# Altium footprint library NDLib.PCBLIB: 499 footprints (part 5 of 32)
Each footprint in its own frame and in the unit in brackets; x right, y up, seen from the top. Pads: shape width x height; smd on the part's side, far side on the other; paste and mask are expansions set on the pad; w line width, h text height; cw(c..) or ccw(c..) is an arc to the next point about the centre after c.
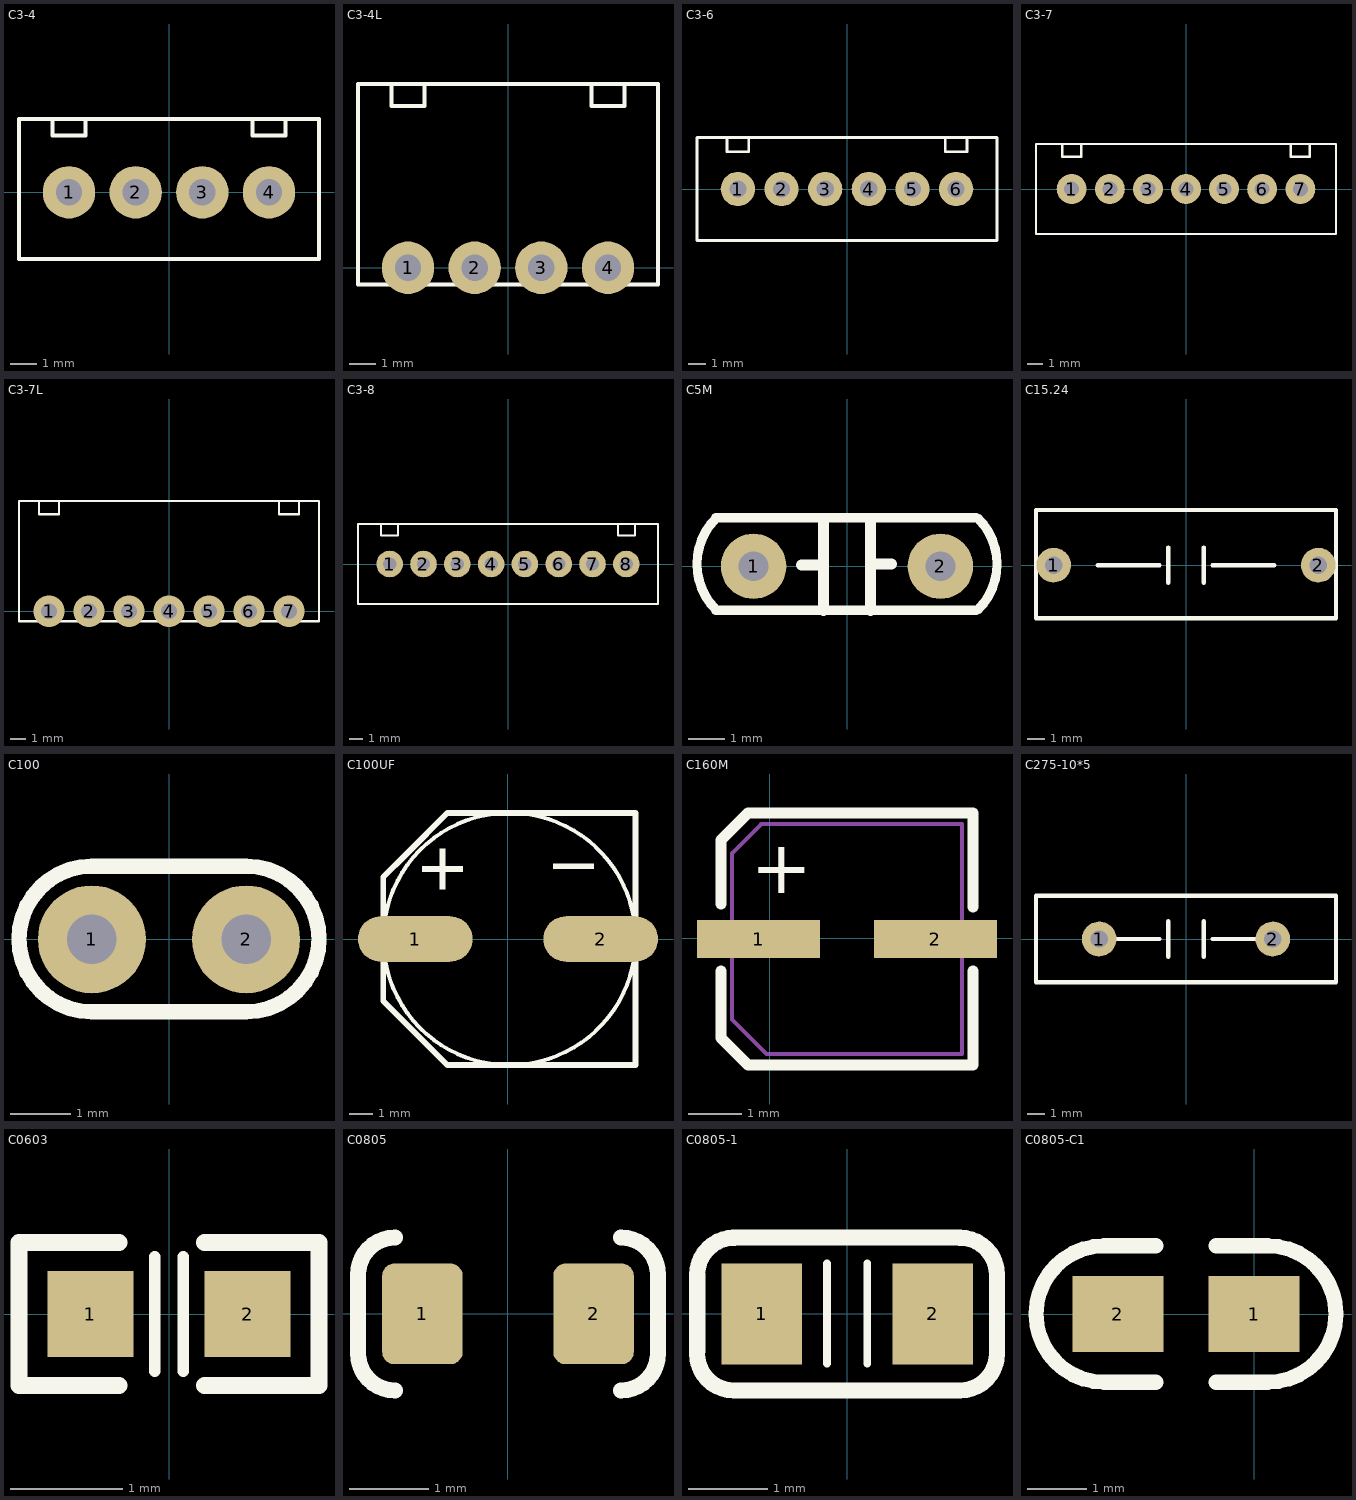
[diagram p4: the footprints below, top view; thin cyan lines are the x and y axes]

## C3-4 [mm]
height 10
pads (4):
  round 2 hole 1: 1(-3.81,0) 2(-1.27,0) 3(1.27,0) 4(3.81,0)
TopOverlay:
  lines w0.152: -4.445,2.794 -4.445,2.159 -3.175,2.159 -3.175,2.794 ; 3.175,2.794 3.175,2.159 4.445,2.159 4.445,2.794 ; -5.715,-2.54 5.715,-2.54 5.715,2.794 -5.715,2.794 -5.715,-2.54
3D body: height 10, standoff 0, extent -5.791,-2.616 5.791,2.87

## C3-4L [mm]
pads (4):
  round 2 hole 1: 1(-3.81,0) 2(-1.27,0) 3(1.27,0) 4(3.81,0)
TopOverlay:
  lines w0.152: -4.445,7 -4.445,6.159 -3.175,6.159 -3.175,7 ; 3.175,7 3.175,6.159 4.445,6.159 4.445,7 ; -5.715,-0.635 -5.715,7 5.715,7 5.715,-0.635 -5.715,-0.635

## C3-6 [mm]
pads (6):
  round 2 hole 1: 1(-6.35,0) 2(-3.81,0) 3(-1.27,0) 4(1.27,0) 5(3.81,0) 6(6.35,0)
TopOverlay:
  lines w0.152: -6.985,3 -6.985,2.159 -5.715,2.159 -5.715,3 ; 5.715,3 5.715,2.159 6.985,2.159 6.985,3 ; -8.73,-3 8.73,-3 8.73,3 -8.73,3 -8.73,-3

## C3-7 [mm]
pads (7):
  round 2 hole 1: 1(-7.62,0) 2(-5.08,0) 3(-2.54,0) 4(0,0) 5(2.54,0) 6(5.08,0) 7(7.62,0)
TopOverlay:
  lines w0.152: -8.255,3 -8.255,2.159 -6.985,2.159 -6.985,3 ; 6.985,3 6.985,2.159 8.255,2.159 8.255,3 ; -10,-3 10,-3 10,3 -10,3 -10,-3

## C3-7L [mm]
pads (7):
  round 2 hole 1: 1(-7.62,0) 2(-5.08,0) 3(-2.54,0) 4(0,0) 5(2.54,0) 6(5.08,0) 7(7.62,0)
TopOverlay:
  lines w0.152: -8.255,7 -8.255,6.159 -6.985,6.159 -6.985,7 ; 6.985,7 6.985,6.159 8.255,6.159 8.255,7 ; -9.525,-0.635 -9.525,7 9.525,7 9.525,-0.635 -9.525,-0.635

## C3-8 [mm]
pads (8):
  round 2 hole 1: 1(-8.89,0) 2(-6.35,0) 3(-3.81,0) 4(-1.27,0) 5(1.27,0) 6(3.81,0) 7(6.35,0) 8(8.89,0)
TopOverlay:
  lines w0.152: -9.525,3 -9.525,2.159 -8.255,2.159 -8.255,3 ; 8.255,3 8.255,2.159 9.525,2.159 9.525,3 ; -11.27,-3 11.27,-3 11.27,3 -11.27,3 -11.27,-3

## C5M [mil]
pads (2):
  round 70 hole 32: 1(-100,0) 2(100,0)
TopOverlay:
  lines w10: -140.35,-47.06 138.19,-47.06 ; -140.35,-46.26 cw(c-91.63,2.46) -140.35,51.18 ; -140.35,51.78 138.19,51.78 ; 140.35,-46.26 ccw(c91.63,2.46) 140.35,51.18
  lines w11.81: -48.53,1.47 -25,1.47 ; -25,-47.06 -25,50 ; 25,-47.06 25,50 ; 25,2.36 47.64,2.36
3D body: height 299.21, standoff -181.1, extent -149.99,-49.2 145.28,49.22

## C15.24 [mm]
pads (2):
  round 2 hole 1: 1(-7.62,0) 2(7.62,0)
TopOverlay:
  lines w0.254: -5.08,0 -1.524,0 ; -1.016,-1.016 -1.016,1.016 ; 1.016,-1.016 1.016,1.016 ; 1.524,0 5.08,0 ; -8.636,-3.048 -8.636,3.175 8.636,3.175 8.636,-3.048 -8.636,-3.048

## C100 [mil]
pads (2):
  round 70 hole 32: 1(-50,0) 2(50,0)
TopOverlay:
  lines w10: -50,-47.06 cw(c-50,0.19) -50,47.43 50,47.43 cw(c50,0.19) 50,-47.06 -50,-47.06

## C100UF [mm]
height 10
pads (2):
  oval 5x2 smd: 1(-4.039,0) 2(4.04,0)
TopOverlay:
  circle w0.17: c0.064,0 r5.5
  rectangle: -3.746,2.921 -1.968,3.175
  region: -2.73,2.159 -2.73,3.937 -2.984,3.937 -2.984,2.159
  region: 3.746,3.302 1.968,3.302 1.968,3.048 3.746,3.048
  lines w0.254: -5.436,-2.7 -5.436,2.7 -4.436,3.7 -2.636,5.5 5.564,5.5 5.564,-5.5 -2.636,-5.5 -3.636,-4.5 -5.436,-2.7

## C160M [mm]
pads (2):
  rect 2.3x0.7 smd: 1(-0.206,-0.011) 2(3.094,-0.011)
TopOverlay:
  lines w0.203: -0.906,-0.611 -0.906,-1.861 -0.406,-2.361 3.794,-2.361 3.794,-0.611 ; -0.906,0.639 -0.906,1.839 -0.406,2.339 3.794,2.339 3.794,0.589
  text "+" at -0.356,0.839 h1
Mechanical1:
  lines w0.076: -0.706,-1.511 -0.056,-2.161 3.594,-2.161 3.594,2.139 -0.156,2.139 -0.706,1.589 -0.706,-0.561 -0.706,-1.511

## C275-10*5 [mm]
height 12
pads (2):
  round 2 hole 1: 1(-5,0) 2(5,0)
TopOverlay:
  lines w0.254: -5.08,0 -1.524,0 ; -1.016,-1.016 -1.016,1.016 ; 1.016,-1.016 1.016,1.016 ; 1.524,0 5.08,0 ; -8.636,-2.5 8.636,-2.5 8.636,2.5 -8.636,2.5 -8.636,-2.5

## C0603 [mil] "贴片0603"
pads (2):
  rect 30x30 smd: 1(-27.5,0) 2(27.5,0)
TopOverlay:
  lines w3.94: -5,-20 -5,20 ; 5,-20 5,20
  lines w6: -17.5,-25 -52.5,-25 -52.5,25 -17.5,25 ; 12.5,-25 52.5,-25 52.5,25 12.5,25

## C0805 [mil]
height 78.74
pads (2):
  rrect30% 40x50 smd: 1(-42.5,0) 2(42.5,0)
TopOverlay:
  lines w8: -74.5,-19.59 ccw(c-56.09,-19.59) -56.09,-38 ; -74.5,-18.59 -74.5,18.5 ; -74.5,19.5 cw(c-56.09,19.5) -56.09,37.91 ; 56.09,-38 ccw(c56.09,-19.59) 74.5,-19.59 ; 56.09,37.91 cw(c56.09,19.5) 74.5,19.5 ; 74.5,-18.59 74.5,18.5
3D body: height 30.39, standoff -0.39, extent -39.35,-24.61 39.39,24.61

## C0805-1 [mil]
height 39.37
pads (2):
  rect 40x50 smd: 1(-42.5,0) 2(42.5,0)
TopOverlay:
  lines w3.94: -10,-24.58 -10,25 ; 10,-24.58 10,25
  lines w8: -74.61,-19.59 ccw(c-56.2,-19.59) -56.2,-38 ; -74.5,-18.5 -74.5,18.5 ; -74.5,19.5 cw(c-56.09,19.5) -56.09,37.91 ; -56.62,38 55.59,38 ; -55.2,-38 55.61,-38 ; 56.09,-38 ccw(c56.09,-19.59) 74.5,-19.59 ; 56.09,37.91 cw(c56.09,19.5) 74.5,19.5 ; 74.5,-18.59 74.5,18.5
3D body: height 30.39, standoff -0.39, extent -39.35,-24.61 39.39,24.61

## C0805-C1 [mil]
height 78.74
pads (2):
  rect 60x50 smd: 1(0,0) 2(-90,0)
TopOverlay:
  lines w10: -65,-45 -99,-45 cw(c-99,0) -99,45 -65,45 ; -25,-45 9,-45 ccw(c9,0) 9,45 -25,45